# Altium schematic symbol library NXP_60_26022015.SCHLIB: 1306 symbols (part 26 of 28) (continued)
## PSMNYS
designator T?, comment N-channel logic level TrenchMOS(TM) transistor    AAL Eindhoven MK
footprint SOT669
pins: 1 2 3 S, 4 G, MB D

## PTN36241B
designator U?, comment PLEASE CHECK AOUT+ AND AOUT-   PTN36241B is a USB 3.0 (SuperSpeed) re-driver that enhances signal quality by performing receive equalization on the deteriorated input signal followed by transmit de-emphasis maximizing system link performance. With its superior differential signal conditioning and enhancement capability, the device delivers significant flexibility and performance scaling for various systems with different PCB trace and cable channel conditions and still benefit from optimum power consumption. PTN36241B is a dual-channel (channel A and channel B) device that supports data signaling rate of 5 Gbit/s through each channel. PTN36241B is flexibly powered from 3.3 V and is available in HVQFN24 4 mm × 4 mm package with 0.5 mm pitch.    AAL Eindhoven MK
footprint SOT616-1
pins: 1 VDD@1 (power), 2 AEQ, 3 ADE/ADD, 4 AOS, 5 CEN, 6 GND@1 (power), 7 SQTH, 8 AIN-, 9 AIN+, 10 GND@2 (power), 11 BOUT- (out), 12 BOUT+ (out), 13 VDD@2 (power), 14 COM, 15 BOS, 16 BDE/SCL, 17 BEQ/SDA, 18 GND@3 (power), 19 BIN+, 20 BIN-, 21 GND@4 (power), 22 AOUT+ (out), 23 AOUT- (out), 25 GND@5 (power)

## PTVSP1UP
designator D?, comment NXP TVS Diode    AAL Eindhoven MK
CLAMPING: 17V; RSV: 10V; CLAMPING: 18.2; RSV: 11V; CLAMPING: 19.9; RSV: 12V; CLAMPING: 21.5V; RSV: 13V; CLAMPING: 23.2V; RSV: 14V; CLAMPING: 24.4V; RSV: 15V; CLAMPING: 26V; RSV: 16V; CLAMPING: 27.6V; CLAMPING: 29.2V; RSV: 18V; CLAMPING: 32.4V; RSV: 20V; CLAMPING: 35.5V; RSV: 22V; CLAMPING: 38.9V; RSV: 24V; CLAMPING: 42.1V; CLAMPING: 45.4V; RSV: 28V; CLAMPING: 48.4V; RSV: 30V; CLAMPING: 53.3V; RSV: 33V; CLAMPING: 58.1V; RSV: 36V; CLAMPING: 8V; RSV: 3.3V; CLAMPING: 64.6V; RSV: 40V; CLAMPING: 69.4V; RSV: 43V; CLAMPING: 72.7V; RSV: 45V; CLAMPING: 77.4V; RSV: 48V; CLAMPING: 82.4V; RSV: 51V; CLAMPING: 87.1V; RSV: 54V; CLAMPING: 93.6V; RSV: 58V; CLAMPING: 9.2V; RSV: 5V; CLAMPING: 96.8V; RSV: 60V; CLAMPING: 103V; RSV: 64V; CLAMPING: 10.3V; RSV: 6V; CLAMPING: 11.2V; RSV: 6.5V; RSV: 7V; CLAMPING: 12.9V; RSV: 7.5V; CLAMPING: 13.6V; CLAMPING: 14.4V; RSV: 8V5; CLAMPING: 15.4V; RSV: 9V; RSV: 17V; RSV: 26V; CLAMPING: 12V; RSV: 8V
footprint SOD128
pins: 1 K, 2 A

## PTVSS1UTR
designator D?, comment NXP TVS Diode    AAL Eindhoven MK
CLAMPING: 17V; RSV: 10V; CLAMPING: 18.2; RSV: 11V; CLAMPING: 19.9; RSV: 12V; CLAMPING: 21.5V; RSV: 13V; CLAMPING: 23.2V; RSV: 14V; CLAMPING: 24.4V; RSV: 15V; CLAMPING: 26V; RSV: 16V; CLAMPING: 27.6V; CLAMPING: 29.2V; RSV: 18V; CLAMPING: 32.4V; RSV: 20V; CLAMPING: 35.5V; RSV: 22V; CLAMPING: 38.9V; RSV: 24V; CLAMPING: 42.1V; CLAMPING: 45.4V; RSV: 28V; CLAMPING: 48.4V; RSV: 30V; CLAMPING: 53.3V; RSV: 33V; CLAMPING: 58.1V; RSV: 36V; CLAMPING: 8V; RSV: 3.3V; CLAMPING: 64.6V; RSV: 40V; CLAMPING: 69.4V; RSV: 43V; CLAMPING: 72.7V; RSV: 45V; CLAMPING: 77.4V; RSV: 48V; CLAMPING: 82.4V; RSV: 51V; CLAMPING: 87.1V; RSV: 54V; CLAMPING: 93.6V; RSV: 58V; CLAMPING: 9.2V; RSV: 5V; CLAMPING: 96.8V; RSV: 60V; CLAMPING: 103V; RSV: 64V; CLAMPING: 10.3V; RSV: 6V; CLAMPING: 11.2V; RSV: 6.5V; RSV: 7V; CLAMPING: 12.9V; RSV: 7.5V; CLAMPING: 13.6V; CLAMPING: 14.4V; RSV: 8V5; CLAMPING: 15.4V; RSV: 9V; RSV: 17V; RSV: 26V; CLAMPING: 12V; RSV: 8V
footprint SOD123W
pins: 1 K, 2 A

## PXAC37KBA
designator U?, comment XA 16-bit microcontroller family 32K/1024 OTP CAN transport layer controller The XA–C3 is a member of the Philips XA (eXtended Architecture) family of high–performance 16–bit single–chip microcontrollers. The XA–C3 combines an array of standard  peripherals together with a PeliCAN CAN 2.0B engine and unique ”Message Management” hardware to provide integrated support for most CAN Transport Layer (CTL) protocols such as DeviceNet, CANopen and OSEK. For additional details, refer to the XA-C3 Overview on page 35.    AAL Eindhoven MK
footprint SOT187-2
pins: 1 22 VSS, 2 P1.0/A0/!WRH!, 3 P1.1/A1, 4 P1.2/A2, 5 P1.3/A3, 6 P1.4/SPIRX, 7 P1.5/SPITX, 8 P1.6/T2/SPICLK, 9 P1.7/T2EX, 10 !RST!, 11 P3.0/RXD0, 12 CANRXD, 13 P3.1/TXD0, 14 P3.2/!INT0!, 15 P3.3/!INT1!, 16 P3.4/T0, 17 P3.5/T1, 18 P3.6/!WRL!, 19 P3.7/!RD!, 20 XTAL2 (out), 21 XTAL1, 23 44 VDD (power), 24 P2.0/A12D8, 25 P2.1/A13D9, 26 P2.2/A14D10, 27 P2.3/A15D11, 28 P2.4/A16D12, 29 P2.5/A17D13, 30 P2.6/A18D14, 31 P2.7/A19D15, 32 !PSEN! (out), 33 ALE/!PROG!, 34 CANTXD, 35 !EA!/WAIT, 36 P0.7/A11/D7, 37 P0.6/A10D6, 38 P0.5/A9D5, 39 P0.4/A8D4, 40 P0.3/A7D3, 41 P0.2/A6D2, 42 P0.1/A5D1, 43 P0.0/A4D0

## PXAC37KBBD
designator U?, comment XA 16-bit microcontroller family 32K/1024 OTP CAN transport layer controller The XA–C3 is a member of the Philips XA (eXtended Architecture) family of high–performance 16–bit single–chip microcontrollers. The XA–C3 combines an array of standard  peripherals together with a PeliCAN CAN 2.0B engine and unique ”Message Management” hardware to provide integrated support for most CAN Transport Layer (CTL) protocols such as DeviceNet, CANopen and OSEK. For additional details, refer to the XA-C3 Overview on page 35.    AAL Eindhoven MK
footprint SOT389-1
pins: 1 P1.5/SPITX, 2 P1.6/T2/SPICLK, 3 P1.7/T2EX, 4 !RST!, 5 P3.0/RXD0, 6 CANRXD, 7 P3.1/TXD0, 8 P3.2/!INT0!, 9 P3.3/!INT1!, 10 P3.4/T0, 11 P3.5/T1, 12 P3.6/!WRL!, 13 P3.7/!RD!, 14 XTAL2 (out), 15 XTAL1, 16 39 VSS, 17 38 VDD (power), 18 P2.0/A12D8, 19 P2.1/A13D9, 20 P2.2/A14D10, 21 P2.3/A15D11, 22 P2.4/A16D12, 23 P2.5/A17D13, 24 P2.6/A18D14, 25 P2.7/A19D15, 26 !PSEN! (out), 27 ALE/!PROG!, 28 CANTXD, 29 !EA!/WAIT, 30 P0.7/A11/D7, 31 P0.6/A10D6, 32 P0.5/A9D5, 33 P0.4/A8D4, 34 P0.3/A7D3, 35 P0.2/A6D2, 36 P0.1/A5D1, 37 P0.0/A4D0, 40 P1.0/A0/!WRH!, 41 P1.1/A1, 42 P1.2/A2, 43 P1.3/A3, 44 P1.4/SPIRX

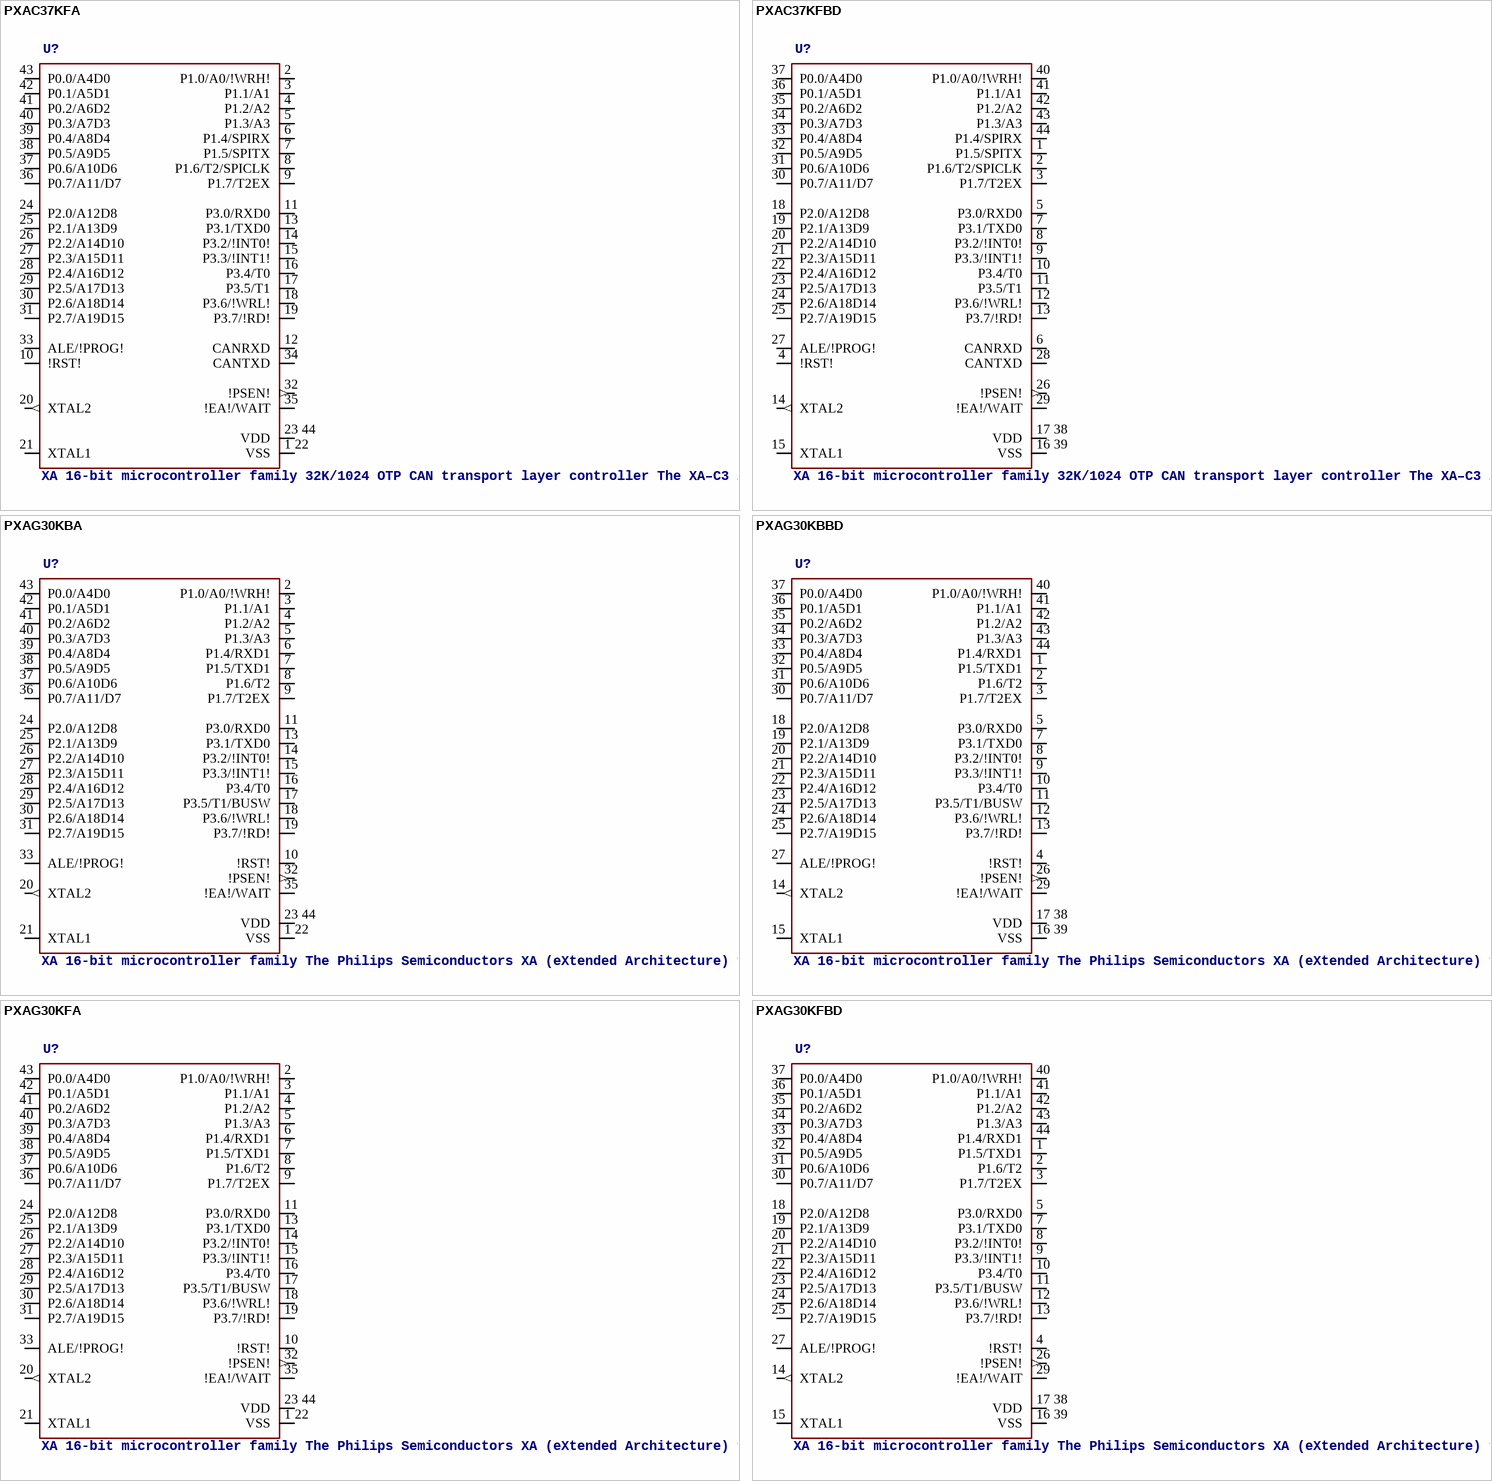
[diagram p174: symbols PXAC37KFA to PXAG30KFBD]

## PXAC37KFA
designator U?, comment XA 16-bit microcontroller family 32K/1024 OTP CAN transport layer controller The XA–C3 is a member of the Philips XA (eXtended Architecture) family of high–performance 16–bit single–chip microcontrollers. The XA–C3 combines an array of standard  peripherals together with a PeliCAN CAN 2.0B engine and unique ”Message Management” hardware to provide integrated support for most CAN Transport Layer (CTL) protocols such as DeviceNet, CANopen and OSEK. For additional details, refer to the XA-C3 Overview on page 35.    AAL Eindhoven MK
footprint SOT187-2
pins: 1 22 VSS, 2 P1.0/A0/!WRH!, 3 P1.1/A1, 4 P1.2/A2, 5 P1.3/A3, 6 P1.4/SPIRX, 7 P1.5/SPITX, 8 P1.6/T2/SPICLK, 9 P1.7/T2EX, 10 !RST!, 11 P3.0/RXD0, 12 CANRXD, 13 P3.1/TXD0, 14 P3.2/!INT0!, 15 P3.3/!INT1!, 16 P3.4/T0, 17 P3.5/T1, 18 P3.6/!WRL!, 19 P3.7/!RD!, 20 XTAL2 (out), 21 XTAL1, 23 44 VDD (power), 24 P2.0/A12D8, 25 P2.1/A13D9, 26 P2.2/A14D10, 27 P2.3/A15D11, 28 P2.4/A16D12, 29 P2.5/A17D13, 30 P2.6/A18D14, 31 P2.7/A19D15, 32 !PSEN! (out), 33 ALE/!PROG!, 34 CANTXD, 35 !EA!/WAIT, 36 P0.7/A11/D7, 37 P0.6/A10D6, 38 P0.5/A9D5, 39 P0.4/A8D4, 40 P0.3/A7D3, 41 P0.2/A6D2, 42 P0.1/A5D1, 43 P0.0/A4D0

## PXAC37KFBD
designator U?, comment XA 16-bit microcontroller family 32K/1024 OTP CAN transport layer controller The XA–C3 is a member of the Philips XA (eXtended Architecture) family of high–performance 16–bit single–chip microcontrollers. The XA–C3 combines an array of standard  peripherals together with a PeliCAN CAN 2.0B engine and unique ”Message Management” hardware to provide integrated support for most CAN Transport Layer (CTL) protocols such as DeviceNet, CANopen and OSEK. For additional details, refer to the XA-C3 Overview on page 35.    AAL Eindhoven MK
footprint SOT389-1
pins: 1 P1.5/SPITX, 2 P1.6/T2/SPICLK, 3 P1.7/T2EX, 4 !RST!, 5 P3.0/RXD0, 6 CANRXD, 7 P3.1/TXD0, 8 P3.2/!INT0!, 9 P3.3/!INT1!, 10 P3.4/T0, 11 P3.5/T1, 12 P3.6/!WRL!, 13 P3.7/!RD!, 14 XTAL2 (out), 15 XTAL1, 16 39 VSS, 17 38 VDD (power), 18 P2.0/A12D8, 19 P2.1/A13D9, 20 P2.2/A14D10, 21 P2.3/A15D11, 22 P2.4/A16D12, 23 P2.5/A17D13, 24 P2.6/A18D14, 25 P2.7/A19D15, 26 !PSEN! (out), 27 ALE/!PROG!, 28 CANTXD, 29 !EA!/WAIT, 30 P0.7/A11/D7, 31 P0.6/A10D6, 32 P0.5/A9D5, 33 P0.4/A8D4, 34 P0.3/A7D3, 35 P0.2/A6D2, 36 P0.1/A5D1, 37 P0.0/A4D0, 40 P1.0/A0/!WRH!, 41 P1.1/A1, 42 P1.2/A2, 43 P1.3/A3, 44 P1.4/SPIRX

## PXAG30KBA
designator U?, comment XA 16-bit microcontroller family The Philips Semiconductors XA (eXtended Architecture) family of 16-bit single-chip microcontrollers is powerful enough to easily handle the requirements of high performance embedded applications, yet inexpensive enough to compete in the market for high-volume, low-cost applications. The XA family provides an upward compatibility path for 80C51 users who need higher performance and 64k or more of program memory. Existing 80C51 code can also easily be translated to run on XA microcontrollers. The performance of the XA architecture supports the comprehensive bit-oriented operations of the 80C51 while incorporating support for multi-tasking operating systems and high-level languages such as C. The speed of the XA architecture, at 10 to 100 times that of the 80C51, gives designers an easy path to truly high performance embedded control.    AAL Eindhoven MK
footprint SOT187-2
pins: 1 22 VSS, 2 P1.0/A0/!WRH!, 3 P1.1/A1, 4 P1.2/A2, 5 P1.3/A3, 6 P1.4/RXD1, 7 P1.5/TXD1, 8 P1.6/T2, 9 P1.7/T2EX, 10 !RST!, 11 P3.0/RXD0, 13 P3.1/TXD0, 14 P3.2/!INT0!, 15 P3.3/!INT1!, 16 P3.4/T0, 17 P3.5/T1/BUSW, 18 P3.6/!WRL!, 19 P3.7/!RD!, 20 XTAL2 (out), 21 XTAL1, 23 44 VDD (power), 24 P2.0/A12D8, 25 P2.1/A13D9, 26 P2.2/A14D10, 27 P2.3/A15D11, 28 P2.4/A16D12, 29 P2.5/A17D13, 30 P2.6/A18D14, 31 P2.7/A19D15, 32 !PSEN! (out), 33 ALE/!PROG!, 35 !EA!/WAIT, 36 P0.7/A11/D7, 37 P0.6/A10D6, 38 P0.5/A9D5, 39 P0.4/A8D4, 40 P0.3/A7D3, 41 P0.2/A6D2, 42 P0.1/A5D1, 43 P0.0/A4D0

## PXAG30KBBD
designator U?, comment XA 16-bit microcontroller family The Philips Semiconductors XA (eXtended Architecture) family of 16-bit single-chip microcontrollers is powerful enough to easily handle the requirements of high performance embedded applications, yet inexpensive enough to compete in the market for high-volume, low-cost applications. The XA family provides an upward compatibility path for 80C51 users who need higher performance and 64k or more of program memory. Existing 80C51 code can also easily be translated to run on XA microcontrollers. The performance of the XA architecture supports the comprehensive bit-oriented operations of the 80C51 while incorporating support for multi-tasking operating systems and high-level languages such as C. The speed of the XA architecture, at 10 to 100 times that of the 80C51, gives designers an easy path to truly high performance embedded control.    AAL Eindhoven MK
footprint SOT389-1
pins: 1 P1.5/TXD1, 2 P1.6/T2, 3 P1.7/T2EX, 4 !RST!, 5 P3.0/RXD0, 7 P3.1/TXD0, 8 P3.2/!INT0!, 9 P3.3/!INT1!, 10 P3.4/T0, 11 P3.5/T1/BUSW, 12 P3.6/!WRL!, 13 P3.7/!RD!, 14 XTAL2 (out), 15 XTAL1, 16 39 VSS, 17 38 VDD (power), 18 P2.0/A12D8, 19 P2.1/A13D9, 20 P2.2/A14D10, 21 P2.3/A15D11, 22 P2.4/A16D12, 23 P2.5/A17D13, 24 P2.6/A18D14, 25 P2.7/A19D15, 26 !PSEN! (out), 27 ALE/!PROG!, 29 !EA!/WAIT, 30 P0.7/A11/D7, 31 P0.6/A10D6, 32 P0.5/A9D5, 33 P0.4/A8D4, 34 P0.3/A7D3, 35 P0.2/A6D2, 36 P0.1/A5D1, 37 P0.0/A4D0, 40 P1.0/A0/!WRH!, 41 P1.1/A1, 42 P1.2/A2, 43 P1.3/A3, 44 P1.4/RXD1

## PXAG30KFA
designator U?, comment XA 16-bit microcontroller family The Philips Semiconductors XA (eXtended Architecture) family of 16-bit single-chip microcontrollers is powerful enough to easily handle the requirements of high performance embedded applications, yet inexpensive enough to compete in the market for high-volume, low-cost applications. The XA family provides an upward compatibility path for 80C51 users who need higher performance and 64k or more of program memory. Existing 80C51 code can also easily be translated to run on XA microcontrollers. The performance of the XA architecture supports the comprehensive bit-oriented operations of the 80C51 while incorporating support for multi-tasking operating systems and high-level languages such as C. The speed of the XA architecture, at 10 to 100 times that of the 80C51, gives designers an easy path to truly high performance embedded control.    AAL Eindhoven MK
footprint SOT187-2
pins: 1 22 VSS, 2 P1.0/A0/!WRH!, 3 P1.1/A1, 4 P1.2/A2, 5 P1.3/A3, 6 P1.4/RXD1, 7 P1.5/TXD1, 8 P1.6/T2, 9 P1.7/T2EX, 10 !RST!, 11 P3.0/RXD0, 13 P3.1/TXD0, 14 P3.2/!INT0!, 15 P3.3/!INT1!, 16 P3.4/T0, 17 P3.5/T1/BUSW, 18 P3.6/!WRL!, 19 P3.7/!RD!, 20 XTAL2 (out), 21 XTAL1, 23 44 VDD (power), 24 P2.0/A12D8, 25 P2.1/A13D9, 26 P2.2/A14D10, 27 P2.3/A15D11, 28 P2.4/A16D12, 29 P2.5/A17D13, 30 P2.6/A18D14, 31 P2.7/A19D15, 32 !PSEN! (out), 33 ALE/!PROG!, 35 !EA!/WAIT, 36 P0.7/A11/D7, 37 P0.6/A10D6, 38 P0.5/A9D5, 39 P0.4/A8D4, 40 P0.3/A7D3, 41 P0.2/A6D2, 42 P0.1/A5D1, 43 P0.0/A4D0

## PXAG30KFBD
designator U?, comment XA 16-bit microcontroller family The Philips Semiconductors XA (eXtended Architecture) family of 16-bit single-chip microcontrollers is powerful enough to easily handle the requirements of high performance embedded applications, yet inexpensive enough to compete in the market for high-volume, low-cost applications. The XA family provides an upward compatibility path for 80C51 users who need higher performance and 64k or more of program memory. Existing 80C51 code can also easily be translated to run on XA microcontrollers. The performance of the XA architecture supports the comprehensive bit-oriented operations of the 80C51 while incorporating support for multi-tasking operating systems and high-level languages such as C. The speed of the XA architecture, at 10 to 100 times that of the 80C51, gives designers an easy path to truly high performance embedded control.    AAL Eindhoven MK
footprint SOT389-1
pins: 1 P1.5/TXD1, 2 P1.6/T2, 3 P1.7/T2EX, 4 !RST!, 5 P3.0/RXD0, 7 P3.1/TXD0, 8 P3.2/!INT0!, 9 P3.3/!INT1!, 10 P3.4/T0, 11 P3.5/T1/BUSW, 12 P3.6/!WRL!, 13 P3.7/!RD!, 14 XTAL2 (out), 15 XTAL1, 16 39 VSS, 17 38 VDD (power), 18 P2.0/A12D8, 19 P2.1/A13D9, 20 P2.2/A14D10, 21 P2.3/A15D11, 22 P2.4/A16D12, 23 P2.5/A17D13, 24 P2.6/A18D14, 25 P2.7/A19D15, 26 !PSEN! (out), 27 ALE/!PROG!, 29 !EA!/WAIT, 30 P0.7/A11/D7, 31 P0.6/A10D6, 32 P0.5/A9D5, 33 P0.4/A8D4, 34 P0.3/A7D3, 35 P0.2/A6D2, 36 P0.1/A5D1, 37 P0.0/A4D0, 40 P1.0/A0/!WRH!, 41 P1.1/A1, 42 P1.2/A2, 43 P1.3/A3, 44 P1.4/RXD1

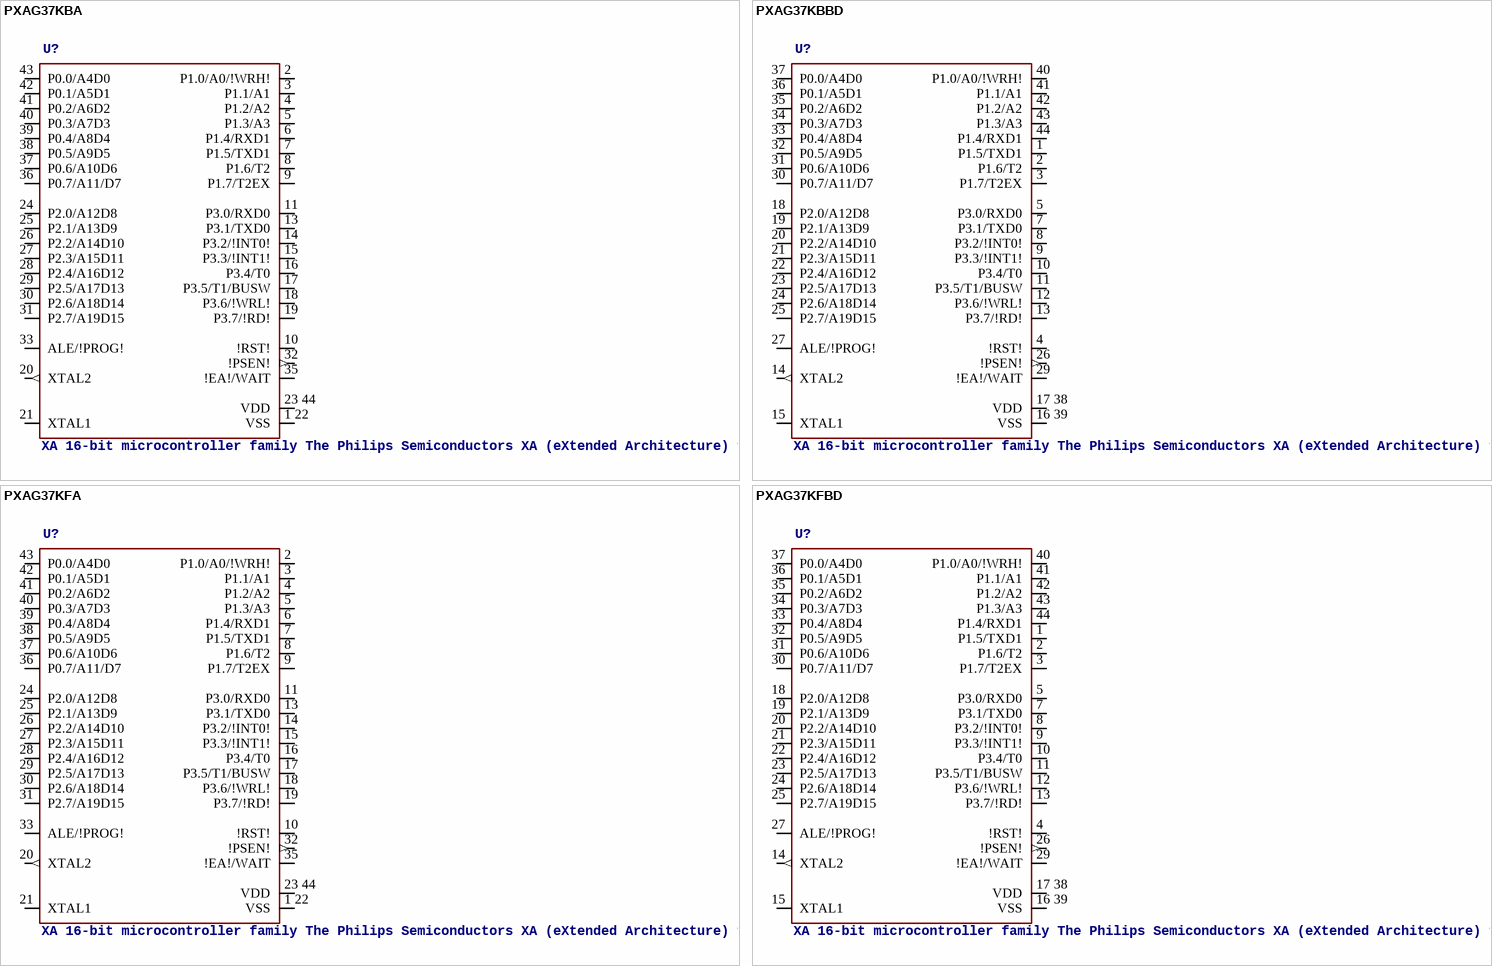
[diagram p175: symbols PXAG37KBA to PXAG37KFBD]

## PXAG37KBA
designator U?, comment XA 16-bit microcontroller family The Philips Semiconductors XA (eXtended Architecture) family of 16-bit single-chip microcontrollers is powerful enough to easily handle the requirements of high performance embedded applications, yet inexpensive enough to compete in the market for high-volume, low-cost applications. The XA family provides an upward compatibility path for 80C51 users who need higher performance and 64k or more of program memory. Existing 80C51 code can also easily be translated to run on XA microcontrollers. The performance of the XA architecture supports the comprehensive bit-oriented operations of the 80C51 while incorporating support for multi-tasking operating systems and high-level languages such as C. The speed of the XA architecture, at 10 to 100 times that of the 80C51, gives designers an easy path to truly high performance embedded control.    AAL Eindhoven MK
footprint SOT187-2
pins: 1 22 VSS, 2 P1.0/A0/!WRH!, 3 P1.1/A1, 4 P1.2/A2, 5 P1.3/A3, 6 P1.4/RXD1, 7 P1.5/TXD1, 8 P1.6/T2, 9 P1.7/T2EX, 10 !RST!, 11 P3.0/RXD0, 13 P3.1/TXD0, 14 P3.2/!INT0!, 15 P3.3/!INT1!, 16 P3.4/T0, 17 P3.5/T1/BUSW, 18 P3.6/!WRL!, 19 P3.7/!RD!, 20 XTAL2 (out), 21 XTAL1, 23 44 VDD (power), 24 P2.0/A12D8, 25 P2.1/A13D9, 26 P2.2/A14D10, 27 P2.3/A15D11, 28 P2.4/A16D12, 29 P2.5/A17D13, 30 P2.6/A18D14, 31 P2.7/A19D15, 32 !PSEN! (out), 33 ALE/!PROG!, 35 !EA!/WAIT, 36 P0.7/A11/D7, 37 P0.6/A10D6, 38 P0.5/A9D5, 39 P0.4/A8D4, 40 P0.3/A7D3, 41 P0.2/A6D2, 42 P0.1/A5D1, 43 P0.0/A4D0

## PXAG37KBBD
designator U?, comment XA 16-bit microcontroller family The Philips Semiconductors XA (eXtended Architecture) family of 16-bit single-chip microcontrollers is powerful enough to easily handle the requirements of high performance embedded applications, yet inexpensive enough to compete in the market for high-volume, low-cost applications. The XA family provides an upward compatibility path for 80C51 users who need higher performance and 64k or more of program memory. Existing 80C51 code can also easily be translated to run on XA microcontrollers. The performance of the XA architecture supports the comprehensive bit-oriented operations of the 80C51 while incorporating support for multi-tasking operating systems and high-level languages such as C. The speed of the XA architecture, at 10 to 100 times that of the 80C51, gives designers an easy path to truly high performance embedded control.    AAL Eindhoven MK
footprint SOT389-1
pins: 1 P1.5/TXD1, 2 P1.6/T2, 3 P1.7/T2EX, 4 !RST!, 5 P3.0/RXD0, 7 P3.1/TXD0, 8 P3.2/!INT0!, 9 P3.3/!INT1!, 10 P3.4/T0, 11 P3.5/T1/BUSW, 12 P3.6/!WRL!, 13 P3.7/!RD!, 14 XTAL2 (out), 15 XTAL1, 16 39 VSS, 17 38 VDD (power), 18 P2.0/A12D8, 19 P2.1/A13D9, 20 P2.2/A14D10, 21 P2.3/A15D11, 22 P2.4/A16D12, 23 P2.5/A17D13, 24 P2.6/A18D14, 25 P2.7/A19D15, 26 !PSEN! (out), 27 ALE/!PROG!, 29 !EA!/WAIT, 30 P0.7/A11/D7, 31 P0.6/A10D6, 32 P0.5/A9D5, 33 P0.4/A8D4, 34 P0.3/A7D3, 35 P0.2/A6D2, 36 P0.1/A5D1, 37 P0.0/A4D0, 40 P1.0/A0/!WRH!, 41 P1.1/A1, 42 P1.2/A2, 43 P1.3/A3, 44 P1.4/RXD1

## PXAG37KFA
designator U?, comment XA 16-bit microcontroller family The Philips Semiconductors XA (eXtended Architecture) family of 16-bit single-chip microcontrollers is powerful enough to easily handle the requirements of high performance embedded applications, yet inexpensive enough to compete in the market for high-volume, low-cost applications. The XA family provides an upward compatibility path for 80C51 users who need higher performance and 64k or more of program memory. Existing 80C51 code can also easily be translated to run on XA microcontrollers. The performance of the XA architecture supports the comprehensive bit-oriented operations of the 80C51 while incorporating support for multi-tasking operating systems and high-level languages such as C. The speed of the XA architecture, at 10 to 100 times that of the 80C51, gives designers an easy path to truly high performance embedded control.    AAL Eindhoven MK
footprint SOT187-2
pins: 1 22 VSS, 2 P1.0/A0/!WRH!, 3 P1.1/A1, 4 P1.2/A2, 5 P1.3/A3, 6 P1.4/RXD1, 7 P1.5/TXD1, 8 P1.6/T2, 9 P1.7/T2EX, 10 !RST!, 11 P3.0/RXD0, 13 P3.1/TXD0, 14 P3.2/!INT0!, 15 P3.3/!INT1!, 16 P3.4/T0, 17 P3.5/T1/BUSW, 18 P3.6/!WRL!, 19 P3.7/!RD!, 20 XTAL2 (out), 21 XTAL1, 23 44 VDD (power), 24 P2.0/A12D8, 25 P2.1/A13D9, 26 P2.2/A14D10, 27 P2.3/A15D11, 28 P2.4/A16D12, 29 P2.5/A17D13, 30 P2.6/A18D14, 31 P2.7/A19D15, 32 !PSEN! (out), 33 ALE/!PROG!, 35 !EA!/WAIT, 36 P0.7/A11/D7, 37 P0.6/A10D6, 38 P0.5/A9D5, 39 P0.4/A8D4, 40 P0.3/A7D3, 41 P0.2/A6D2, 42 P0.1/A5D1, 43 P0.0/A4D0

## PXAG37KFBD
designator U?, comment XA 16-bit microcontroller family The Philips Semiconductors XA (eXtended Architecture) family of 16-bit single-chip microcontrollers is powerful enough to easily handle the requirements of high performance embedded applications, yet inexpensive enough to compete in the market for high-volume, low-cost applications. The XA family provides an upward compatibility path for 80C51 users who need higher performance and 64k or more of program memory. Existing 80C51 code can also easily be translated to run on XA microcontrollers. The performance of the XA architecture supports the comprehensive bit-oriented operations of the 80C51 while incorporating support for multi-tasking operating systems and high-level languages such as C. The speed of the XA architecture, at 10 to 100 times that of the 80C51, gives designers an easy path to truly high performance embedded control.    AAL Eindhoven MK
footprint SOT389-1
pins: 1 P1.5/TXD1, 2 P1.6/T2, 3 P1.7/T2EX, 4 !RST!, 5 P3.0/RXD0, 7 P3.1/TXD0, 8 P3.2/!INT0!, 9 P3.3/!INT1!, 10 P3.4/T0, 11 P3.5/T1/BUSW, 12 P3.6/!WRL!, 13 P3.7/!RD!, 14 XTAL2 (out), 15 XTAL1, 16 39 VSS, 17 38 VDD (power), 18 P2.0/A12D8, 19 P2.1/A13D9, 20 P2.2/A14D10, 21 P2.3/A15D11, 22 P2.4/A16D12, 23 P2.5/A17D13, 24 P2.6/A18D14, 25 P2.7/A19D15, 26 !PSEN! (out), 27 ALE/!PROG!, 29 !EA!/WAIT, 30 P0.7/A11/D7, 31 P0.6/A10D6, 32 P0.5/A9D5, 33 P0.4/A8D4, 34 P0.3/A7D3, 35 P0.2/A6D2, 36 P0.1/A5D1, 37 P0.0/A4D0, 40 P1.0/A0/!WRH!, 41 P1.1/A1, 42 P1.2/A2, 43 P1.3/A3, 44 P1.4/RXD1

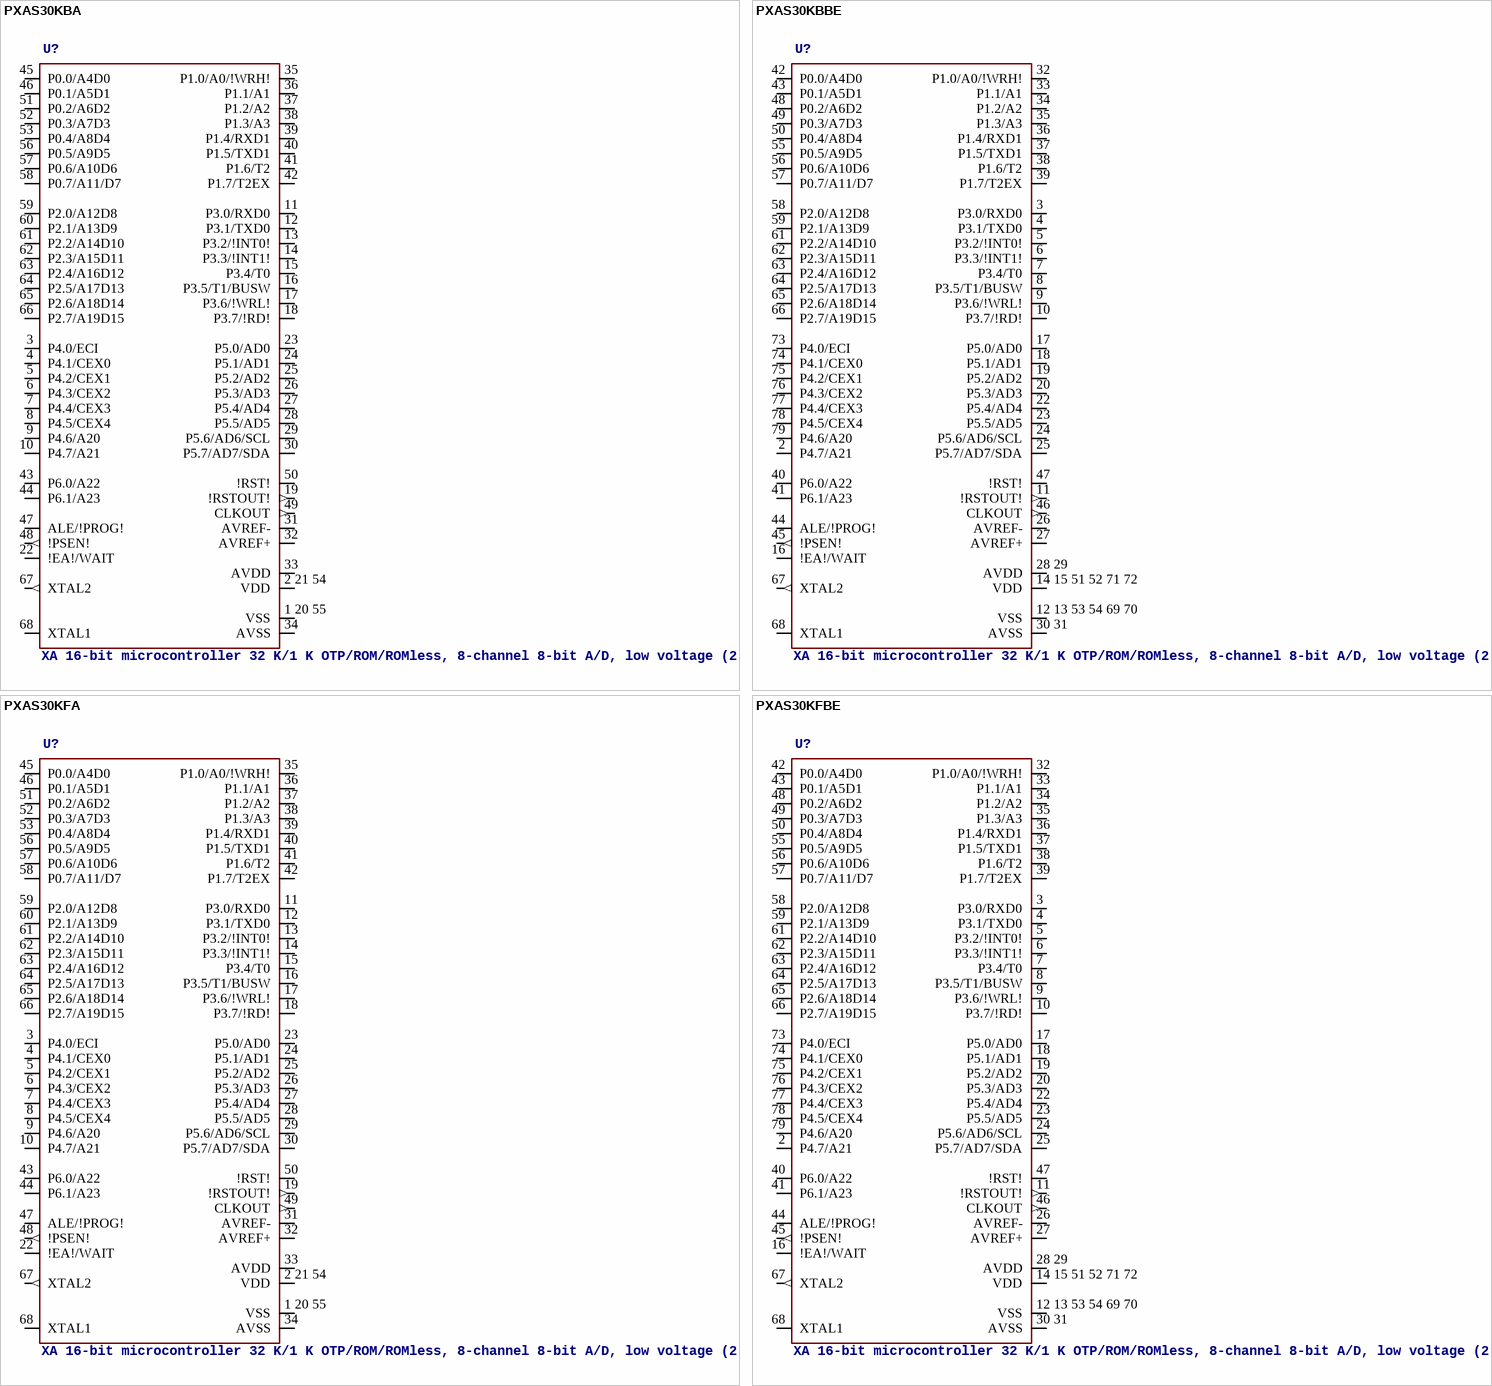
[diagram p176: symbols PXAS30KBA to PXAS30KFBE]

## PXAS30KBA
designator U?, comment XA 16-bit microcontroller 32 K/1 K OTP/ROM/ROMless, 8-channel 8-bit A/D, low voltage (2.7 V–5.5 V), I2C, 2 UARTs, 16 MB address range The XA-S3 device is a member of NXP Semiconductors’ XA (eXtended Architecture) family of high performance 16-bit single-chip microcontrollers. The XA-S3 device combines many powerful peripherals on one chip. With its high performance A/D converter, timers/counters, watchdog, Programmable Counter Array (PCA), I2C interface, dual UARTs, and multiple general purpose I/O ports, it is suited for general multipurpose high performance embedded control functions.    AAL Eindhoven MK
footprint SOT188
pins: 1 20 55 VSS, 2 21 54 VDD (power), 3 P4.0/ECI, 4 P4.1/CEX0, 5 P4.2/CEX1, 6 P4.3/CEX2, 7 P4.4/CEX3, 8 P4.5/CEX4, 9 P4.6/A20, 10 P4.7/A21, 11 P3.0/RXD0, 12 P3.1/TXD0, 13 P3.2/!INT0!, 14 P3.3/!INT1!, 15 P3.4/T0, 16 P3.5/T1/BUSW, 17 P3.6/!WRL!, 18 P3.7/!RD!, 19 !RSTOUT! (out), 22 !EA!/WAIT, 23 P5.0/AD0, 24 P5.1/AD1, 25 P5.2/AD2, 26 P5.3/AD3, 27 P5.4/AD4, 28 P5.5/AD5, 29 P5.6/AD6/SCL, 30 P5.7/AD7/SDA, 31 AVREF-, 32 AVREF+, 33 AVDD (power), 34 AVSS (power), 35 P1.0/A0/!WRH!, 36 P1.1/A1, 37 P1.2/A2, 38 P1.3/A3, 39 P1.4/RXD1, 40 P1.5/TXD1, 41 P1.6/T2, 42 P1.7/T2EX, 43 P6.0/A22, 44 P6.1/A23, 45 P0.0/A4D0, 46 P0.1/A5D1, 47 ALE/!PROG!, 48 !PSEN! (out), 49 CLKOUT (out), 50 !RST!, 51 P0.2/A6D2, 52 P0.3/A7D3, 53 P0.4/A8D4, 56 P0.5/A9D5, 57 P0.6/A10D6, 58 P0.7/A11/D7, 59 P2.0/A12D8, 60 P2.1/A13D9, 61 P2.2/A14D10, 62 P2.3/A15D11, 63 P2.4/A16D12, 64 P2.5/A17D13, 65 P2.6/A18D14, 66 P2.7/A19D15, 67 XTAL2 (out), 68 XTAL1

## PXAS30KBBE
designator U?, comment XA 16-bit microcontroller 32 K/1 K OTP/ROM/ROMless, 8-channel 8-bit A/D, low voltage (2.7 V–5.5 V), I2C, 2 UARTs, 16 MB address range The XA-S3 device is a member of NXP Semiconductors’ XA (eXtended Architecture) family of high performance 16-bit single-chip microcontrollers. The XA-S3 device combines many powerful peripherals on one chip. With its high performance A/D converter, timers/counters, watchdog, Programmable Counter Array (PCA), I2C interface, dual UARTs, and multiple general purpose I/O ports, it is suited for general multipurpose high performance embedded control functions.    AAL Eindhoven MK
footprint SOT315-1
pins: 2 P4.7/A21, 3 P3.0/RXD0, 4 P3.1/TXD0, 5 P3.2/!INT0!, 6 P3.3/!INT1!, 7 P3.4/T0, 8 P3.5/T1/BUSW, 9 P3.6/!WRL!, 10 P3.7/!RD!, 11 !RSTOUT! (out), 12 13 53 54 69 70 VSS, 14 15 51 52 71 72 VDD (power), 16 !EA!/WAIT, 17 P5.0/AD0, 18 P5.1/AD1, 19 P5.2/AD2, 20 P5.3/AD3, 22 P5.4/AD4, 23 P5.5/AD5, 24 P5.6/AD6/SCL, 25 P5.7/AD7/SDA, 26 AVREF-, 27 AVREF+, 28 29 AVDD (power), 30 31 AVSS (power), 32 P1.0/A0/!WRH!, 33 P1.1/A1, 34 P1.2/A2, 35 P1.3/A3, 36 P1.4/RXD1, 37 P1.5/TXD1, 38 P1.6/T2, 39 P1.7/T2EX, 40 P6.0/A22, 41 P6.1/A23, 42 P0.0/A4D0, 43 P0.1/A5D1, 44 ALE/!PROG!, 45 !PSEN! (out), 46 CLKOUT (out), 47 !RST!, 48 P0.2/A6D2, 49 P0.3/A7D3, 50 P0.4/A8D4, 55 P0.5/A9D5, 56 P0.6/A10D6, 57 P0.7/A11/D7, 58 P2.0/A12D8, 59 P2.1/A13D9, 61 P2.2/A14D10, 62 P2.3/A15D11, 63 P2.4/A16D12, 64 P2.5/A17D13, 65 P2.6/A18D14, 66 P2.7/A19D15, 67 XTAL2 (out), 68 XTAL1, 73 P4.0/ECI, 74 P4.1/CEX0, 75 P4.2/CEX1, 76 P4.3/CEX2, 77 P4.4/CEX3, 78 P4.5/CEX4, 79 P4.6/A20

## PXAS30KFA
designator U?, comment XA 16-bit microcontroller 32 K/1 K OTP/ROM/ROMless, 8-channel 8-bit A/D, low voltage (2.7 V–5.5 V), I2C, 2 UARTs, 16 MB address range The XA-S3 device is a member of NXP Semiconductors’ XA (eXtended Architecture) family of high performance 16-bit single-chip microcontrollers. The XA-S3 device combines many powerful peripherals on one chip. With its high performance A/D converter, timers/counters, watchdog, Programmable Counter Array (PCA), I2C interface, dual UARTs, and multiple general purpose I/O ports, it is suited for general multipurpose high performance embedded control functions.    AAL Eindhoven MK
footprint SOT188
pins: 1 20 55 VSS, 2 21 54 VDD (power), 3 P4.0/ECI, 4 P4.1/CEX0, 5 P4.2/CEX1, 6 P4.3/CEX2, 7 P4.4/CEX3, 8 P4.5/CEX4, 9 P4.6/A20, 10 P4.7/A21, 11 P3.0/RXD0, 12 P3.1/TXD0, 13 P3.2/!INT0!, 14 P3.3/!INT1!, 15 P3.4/T0, 16 P3.5/T1/BUSW, 17 P3.6/!WRL!, 18 P3.7/!RD!, 19 !RSTOUT! (out), 22 !EA!/WAIT, 23 P5.0/AD0, 24 P5.1/AD1, 25 P5.2/AD2, 26 P5.3/AD3, 27 P5.4/AD4, 28 P5.5/AD5, 29 P5.6/AD6/SCL, 30 P5.7/AD7/SDA, 31 AVREF-, 32 AVREF+, 33 AVDD (power), 34 AVSS (power), 35 P1.0/A0/!WRH!, 36 P1.1/A1, 37 P1.2/A2, 38 P1.3/A3, 39 P1.4/RXD1, 40 P1.5/TXD1, 41 P1.6/T2, 42 P1.7/T2EX, 43 P6.0/A22, 44 P6.1/A23, 45 P0.0/A4D0, 46 P0.1/A5D1, 47 ALE/!PROG!, 48 !PSEN! (out), 49 CLKOUT (out), 50 !RST!, 51 P0.2/A6D2, 52 P0.3/A7D3, 53 P0.4/A8D4, 56 P0.5/A9D5, 57 P0.6/A10D6, 58 P0.7/A11/D7, 59 P2.0/A12D8, 60 P2.1/A13D9, 61 P2.2/A14D10, 62 P2.3/A15D11, 63 P2.4/A16D12, 64 P2.5/A17D13, 65 P2.6/A18D14, 66 P2.7/A19D15, 67 XTAL2 (out), 68 XTAL1

## PXAS30KFBE
designator U?, comment XA 16-bit microcontroller 32 K/1 K OTP/ROM/ROMless, 8-channel 8-bit A/D, low voltage (2.7 V–5.5 V), I2C, 2 UARTs, 16 MB address range The XA-S3 device is a member of NXP Semiconductors’ XA (eXtended Architecture) family of high performance 16-bit single-chip microcontrollers. The XA-S3 device combines many powerful peripherals on one chip. With its high performance A/D converter, timers/counters, watchdog, Programmable Counter Array (PCA), I2C interface, dual UARTs, and multiple general purpose I/O ports, it is suited for general multipurpose high performance embedded control functions.    AAL Eindhoven MK
footprint SOT315-1
pins: 2 P4.7/A21, 3 P3.0/RXD0, 4 P3.1/TXD0, 5 P3.2/!INT0!, 6 P3.3/!INT1!, 7 P3.4/T0, 8 P3.5/T1/BUSW, 9 P3.6/!WRL!, 10 P3.7/!RD!, 11 !RSTOUT! (out), 12 13 53 54 69 70 VSS, 14 15 51 52 71 72 VDD (power), 16 !EA!/WAIT, 17 P5.0/AD0, 18 P5.1/AD1, 19 P5.2/AD2, 20 P5.3/AD3, 22 P5.4/AD4, 23 P5.5/AD5, 24 P5.6/AD6/SCL, 25 P5.7/AD7/SDA, 26 AVREF-, 27 AVREF+, 28 29 AVDD (power), 30 31 AVSS (power), 32 P1.0/A0/!WRH!, 33 P1.1/A1, 34 P1.2/A2, 35 P1.3/A3, 36 P1.4/RXD1, 37 P1.5/TXD1, 38 P1.6/T2, 39 P1.7/T2EX, 40 P6.0/A22, 41 P6.1/A23, 42 P0.0/A4D0, 43 P0.1/A5D1, 44 ALE/!PROG!, 45 !PSEN! (out), 46 CLKOUT (out), 47 !RST!, 48 P0.2/A6D2, 49 P0.3/A7D3, 50 P0.4/A8D4, 55 P0.5/A9D5, 56 P0.6/A10D6, 57 P0.7/A11/D7, 58 P2.0/A12D8, 59 P2.1/A13D9, 61 P2.2/A14D10, 62 P2.3/A15D11, 63 P2.4/A16D12, 64 P2.5/A17D13, 65 P2.6/A18D14, 66 P2.7/A19D15, 67 XTAL2 (out), 68 XTAL1, 73 P4.0/ECI, 74 P4.1/CEX0, 75 P4.2/CEX1, 76 P4.3/CEX2, 77 P4.4/CEX3, 78 P4.5/CEX4, 79 P4.6/A20